# Altium schematic symbol library jlcpcb_2025_04_capacitors_extended_0603.schlib: 3668 symbols (part 19 of 20) (continued)
## RF18N180F500CT
designator C?  Capacitance: 18pF  (hidden comment: *)
Capacitor, Ceramic (MLCC), 18pF, 50V, NP0, SMD 0603; Manufacturer: Walsin Tech Corp; Manufacturer Part Number: RF18N180F500CT; Package Size: 0603; JLCPCB Basic Part: No; JLCPCB Part Number: C2909435; Supplier 1: LCSC; Category: Capacitors - MLCC; Supplier Part Number 1: C2909435; Voltage Rating: 50V; Temperature Coefficient: NP0; RoHS: Yes; ComponentLink1Description: Datasheet; ComponentLink1URL: https://wmsc.lcsc.com/wmsc/upload/file/pdf/v2/lcsc/2110281730_Walsin-Tech-Corp-RF18N180F500CT_C2909435.pdf; ComponentLink2Description: JLCPCB Part URL; ComponentLink2URL: https://jlcpcb.com/partdetail/C2909435; ComponentLink3Description: LCSC Part URL; ComponentLink3URL: https://lcsc.com/product-detail/Multilayer-Ceramic-Capacitors-MLCC---SMD-SMT_Walsin-Tech-Corp-Walsin-Tech-Corp-RF18N180F500CT_C2909435.html
footprint CAP-0603 (0603 (1608M) Capacitor)
pins: 1, 2

## RF18N470F500CT
designator C?  Capacitance: 47pF  (hidden comment: *)
Capacitor, Ceramic (MLCC), 47pF, 50V, NP0, SMD 0603; Manufacturer: Walsin Tech Corp; Manufacturer Part Number: RF18N470F500CT; Package Size: 0603; JLCPCB Basic Part: No; JLCPCB Part Number: C2909457; Supplier 1: LCSC; Category: Capacitors - MLCC; Supplier Part Number 1: C2909457; Voltage Rating: 50V; Temperature Coefficient: NP0; RoHS: Yes; ComponentLink1Description: Datasheet; ComponentLink1URL: https://wmsc.lcsc.com/wmsc/upload/file/pdf/v2/lcsc/2110281730_Walsin-Tech-Corp-RF18N470F500CT_C2909457.pdf; ComponentLink2Description: JLCPCB Part URL; ComponentLink2URL: https://jlcpcb.com/partdetail/C2909457; ComponentLink3Description: LCSC Part URL; ComponentLink3URL: https://lcsc.com/product-detail/Multilayer-Ceramic-Capacitors-MLCC---SMD-SMT_Walsin-Tech-Corp-Walsin-Tech-Corp-RF18N470F500CT_C2909457.html
footprint CAP-0603 (0603 (1608M) Capacitor)
pins: 1, 2

## SH18B104K101CT
designator C?  Capacitance: 100nF  (hidden comment: *)
Capacitor, Ceramic (MLCC), 100nF, 100V, X7R, SMD 0603; Manufacturer: Walsin Tech Corp; Manufacturer Part Number: SH18B104K101CT; Package Size: 0603; JLCPCB Basic Part: No; JLCPCB Part Number: C2894188; Supplier 1: LCSC; Category: Capacitors - MLCC; Supplier Part Number 1: C2894188; Voltage Rating: 100V; Temperature Coefficient: X7R; RoHS: Yes; ComponentLink1Description: Datasheet; ComponentLink1URL: https://wmsc.lcsc.com/wmsc/upload/file/pdf/v2/lcsc/2109081830_Walsin-Tech-Corp-SH18B104K101CT_C2894188.pdf; ComponentLink2Description: JLCPCB Part URL; ComponentLink2URL: https://jlcpcb.com/partdetail/C2894188; ComponentLink3Description: LCSC Part URL; ComponentLink3URL: https://lcsc.com/product-detail/Multilayer-Ceramic-Capacitors-MLCC---SMD-SMT_Walsin-Tech-Corp-Walsin-Tech-Corp-SH18B104K101CT_C2894188.html
footprint CAP-0603 (0603 (1608M) Capacitor)
pins: 1, 2

## TCC0603COG0R8B500CT
designator C?  Capacitance: 0.8pF  (hidden comment: *)
Capacitor, Ceramic (MLCC), 0.8pF, null, null, SMD 0603; Manufacturer: CCTC; Manufacturer Part Number: TCC0603COG0R8B500CT; Package Size: 0603; JLCPCB Basic Part: No; JLCPCB Part Number: C5375810; Supplier 1: LCSC; Category: Capacitors - MLCC; Supplier Part Number 1: C5375810; Voltage Rating: null; Temperature Coefficient: null; RoHS: Yes; ComponentLink1Description: Datasheet; ComponentLink1URL: https://wmsc.lcsc.com/wmsc/upload/file/pdf/v2/lcsc/2403281709_CCTC-TCC0603COG0R8B500CT_C5375810.pdf; ComponentLink2Description: JLCPCB Part URL; ComponentLink2URL: https://jlcpcb.com/partdetail/C5375810; ComponentLink3Description: LCSC Part URL; ComponentLink3URL: https://lcsc.com/product-detail/Multilayer-Ceramic-Capacitors-MLCC---SMD-SMT_CCTC-CCTC-TCC0603COG0R8B500CT_C5375810.html
footprint CAP-0603 (0603 (1608M) Capacitor)
pins: 1, 2

## TCC0603COG1R0C500CT
designator C?  Capacitance: 1pF  (hidden comment: *)
Capacitor, Ceramic (MLCC), 1pF, 50V, C0G, SMD 0603; Manufacturer: CCTC; Manufacturer Part Number: TCC0603COG1R0C500CT; Package Size: 0603; JLCPCB Basic Part: No; JLCPCB Part Number: C282497; Supplier 1: LCSC; Category: Capacitors - MLCC; Supplier Part Number 1: C282497; Voltage Rating: 50V; Temperature Coefficient: C0G; RoHS: Yes; ComponentLink1Description: Datasheet; ComponentLink1URL: https://wmsc.lcsc.com/wmsc/upload/file/pdf/v2/lcsc/2304140030_CCTC-TCC0603COG1R0C500CT_C282497.pdf; ComponentLink2Description: JLCPCB Part URL; ComponentLink2URL: https://jlcpcb.com/partdetail/C282497; ComponentLink3Description: LCSC Part URL; ComponentLink3URL: https://lcsc.com/product-detail/Multilayer-Ceramic-Capacitors-MLCC---SMD-SMT_CCTC-CCTC-TCC0603COG1R0C500CT_C282497.html
footprint CAP-0603 (0603 (1608M) Capacitor)
pins: 1, 2

## TCC0603COG1R2C500CT
designator C?  Capacitance: 1.2pF  (hidden comment: *)
Capacitor, Ceramic (MLCC), 1.2pF, 50V, C0G, SMD 0603; Manufacturer: CCTC; Manufacturer Part Number: TCC0603COG1R2C500CT; Package Size: 0603; JLCPCB Basic Part: No; JLCPCB Part Number: C282498; Supplier 1: LCSC; Category: Capacitors - MLCC; Supplier Part Number 1: C282498; Voltage Rating: 50V; Temperature Coefficient: C0G; RoHS: Yes; ComponentLink1Description: Datasheet; ComponentLink1URL: https://wmsc.lcsc.com/wmsc/upload/file/pdf/v2/lcsc/2304140030_CCTC-TCC0603COG1R2C500CT_C282498.pdf; ComponentLink2Description: JLCPCB Part URL; ComponentLink2URL: https://jlcpcb.com/partdetail/C282498; ComponentLink3Description: LCSC Part URL; ComponentLink3URL: https://lcsc.com/product-detail/Multilayer-Ceramic-Capacitors-MLCC---SMD-SMT_CCTC-CCTC-TCC0603COG1R2C500CT_C282498.html
footprint CAP-0603 (0603 (1608M) Capacitor)
pins: 1, 2

## TCC0603COG1R5C500CT
designator C?  Capacitance: 1.5pF  (hidden comment: *)
Capacitor, Ceramic (MLCC), 1.5pF, 50V, C0G, SMD 0603; Manufacturer: CCTC; Manufacturer Part Number: TCC0603COG1R5C500CT; Package Size: 0603; JLCPCB Basic Part: No; JLCPCB Part Number: C376772; Supplier 1: LCSC; Category: Capacitors - MLCC; Supplier Part Number 1: C376772; Voltage Rating: 50V; Temperature Coefficient: C0G; RoHS: Yes; ComponentLink1Description: Datasheet; ComponentLink1URL: https://wmsc.lcsc.com/wmsc/upload/file/pdf/v2/lcsc/2304140030_CCTC-TCC0603COG1R5C500CT_C376772.pdf; ComponentLink2Description: JLCPCB Part URL; ComponentLink2URL: https://jlcpcb.com/partdetail/C376772; ComponentLink3Description: LCSC Part URL; ComponentLink3URL: https://lcsc.com/product-detail/Multilayer-Ceramic-Capacitors-MLCC---SMD-SMT_CCTC-CCTC-TCC0603COG1R5C500CT_C376772.html
footprint CAP-0603 (0603 (1608M) Capacitor)
pins: 1, 2

## TCC0603COG2R0B500CT
designator C?  Capacitance: 2pF  (hidden comment: *)
Capacitor, Ceramic (MLCC), 2pF, null, C0G, SMD 0603; Manufacturer: CCTC; Manufacturer Part Number: TCC0603COG2R0B500CT; Package Size: 0603; JLCPCB Basic Part: No; JLCPCB Part Number: C5375823; Supplier 1: LCSC; Category: Capacitors - MLCC; Supplier Part Number 1: C5375823; Voltage Rating: null; Temperature Coefficient: C0G; RoHS: Yes; ComponentLink1Description: Datasheet; ComponentLink2Description: JLCPCB Part URL; ComponentLink2URL: https://jlcpcb.com/partdetail/C5375823; ComponentLink3Description: LCSC Part URL; ComponentLink3URL: https://lcsc.com/product-detail/Multilayer-Ceramic-Capacitors-MLCC---SMD-SMT_CCTC-CCTC-TCC0603COG2R0B500CT_C5375823.html
footprint CAP-0603 (0603 (1608M) Capacitor)
pins: 1, 2

## TCC0603COG2R0C500CT
designator C?  Capacitance: 2pF  (hidden comment: *)
Capacitor, Ceramic (MLCC), 2pF, 50V, C0G, SMD 0603; Manufacturer: CCTC; Manufacturer Part Number: TCC0603COG2R0C500CT; Package Size: 0603; JLCPCB Basic Part: No; JLCPCB Part Number: C282500; Supplier 1: LCSC; Category: Capacitors - MLCC; Supplier Part Number 1: C282500; Voltage Rating: 50V; Temperature Coefficient: C0G; RoHS: Yes; ComponentLink1Description: Datasheet; ComponentLink1URL: https://wmsc.lcsc.com/wmsc/upload/file/pdf/v2/lcsc/2304140030_CCTC-TCC0603COG2R0C500CT_C282500.pdf; ComponentLink2Description: JLCPCB Part URL; ComponentLink2URL: https://jlcpcb.com/partdetail/C282500; ComponentLink3Description: LCSC Part URL; ComponentLink3URL: https://lcsc.com/product-detail/Multilayer-Ceramic-Capacitors-MLCC---SMD-SMT_CCTC-CCTC-TCC0603COG2R0C500CT_C282500.html
footprint CAP-0603 (0603 (1608M) Capacitor)
pins: 1, 2

## TCC0603COG2R2C500CT
designator C?  Capacitance: 2.2pF  (hidden comment: *)
Capacitor, Ceramic (MLCC), 2.2pF, 50V, C0G, SMD 0603; Manufacturer: CCTC; Manufacturer Part Number: TCC0603COG2R2C500CT; Package Size: 0603; JLCPCB Basic Part: No; JLCPCB Part Number: C376780; Supplier 1: LCSC; Category: Capacitors - MLCC; Supplier Part Number 1: C376780; Voltage Rating: 50V; Temperature Coefficient: C0G; RoHS: Yes; ComponentLink1Description: Datasheet; ComponentLink1URL: https://wmsc.lcsc.com/wmsc/upload/file/pdf/v2/lcsc/2304140030_CCTC-TCC0603COG2R2C500CT_C376780.pdf; ComponentLink2Description: JLCPCB Part URL; ComponentLink2URL: https://jlcpcb.com/partdetail/C376780; ComponentLink3Description: LCSC Part URL; ComponentLink3URL: https://lcsc.com/product-detail/Multilayer-Ceramic-Capacitors-MLCC---SMD-SMT_CCTC-CCTC-TCC0603COG2R2C500CT_C376780.html
footprint CAP-0603 (0603 (1608M) Capacitor)
pins: 1, 2

## TCC0603COG2R4B500CT
designator C?  Capacitance: 2.4pF  (hidden comment: *)
Capacitor, Ceramic (MLCC), 2.4pF, null, null, SMD 0603; Manufacturer: CCTC; Manufacturer Part Number: TCC0603COG2R4B500CT; Package Size: 0603; JLCPCB Basic Part: No; JLCPCB Part Number: C5448887; Supplier 1: LCSC; Category: Capacitors - MLCC; Supplier Part Number 1: C5448887; Voltage Rating: null; Temperature Coefficient: null; RoHS: Yes; ComponentLink1Description: Datasheet; ComponentLink2Description: JLCPCB Part URL; ComponentLink2URL: https://jlcpcb.com/partdetail/C5448887; ComponentLink3Description: LCSC Part URL; ComponentLink3URL: https://lcsc.com/product-detail/Multilayer-Ceramic-Capacitors-MLCC---SMD-SMT_CCTC-CCTC-TCC0603COG2R4B500CT_C5448887.html
footprint CAP-0603 (0603 (1608M) Capacitor)
pins: 1, 2

## TCC0603COG2R4C500CT
designator C?  Capacitance: 2.4pF  (hidden comment: *)
Capacitor, Ceramic (MLCC), 2.4pF, 50V, C0G, SMD 0603; Manufacturer: CCTC; Manufacturer Part Number: TCC0603COG2R4C500CT; Package Size: 0603; JLCPCB Basic Part: No; JLCPCB Part Number: C880623; Supplier 1: LCSC; Category: Capacitors - MLCC; Supplier Part Number 1: C880623; Voltage Rating: 50V; Temperature Coefficient: C0G; RoHS: Yes; ComponentLink1Description: Datasheet; ComponentLink1URL: https://wmsc.lcsc.com/wmsc/upload/file/pdf/v2/lcsc/2304140030_CCTC-TCC0603COG2R4C500CT_C880623.pdf; ComponentLink2Description: JLCPCB Part URL; ComponentLink2URL: https://jlcpcb.com/partdetail/C880623; ComponentLink3Description: LCSC Part URL; ComponentLink3URL: https://lcsc.com/product-detail/Multilayer-Ceramic-Capacitors-MLCC---SMD-SMT_CCTC-CCTC-TCC0603COG2R4C500CT_C880623.html
footprint CAP-0603 (0603 (1608M) Capacitor)
pins: 1, 2

## TCC0603COG2R7C500CT
designator C?  Capacitance: 2.7pF  (hidden comment: *)
Capacitor, Ceramic (MLCC), 2.7pF, 50V, C0G, SMD 0603; Manufacturer: CCTC; Manufacturer Part Number: TCC0603COG2R7C500CT; Package Size: 0603; JLCPCB Basic Part: No; JLCPCB Part Number: C376781; Supplier 1: LCSC; Category: Capacitors - MLCC; Supplier Part Number 1: C376781; Voltage Rating: 50V; Temperature Coefficient: C0G; RoHS: Yes; ComponentLink1Description: Datasheet; ComponentLink1URL: https://wmsc.lcsc.com/wmsc/upload/file/pdf/v2/lcsc/2304140030_CCTC-TCC0603COG2R7C500CT_C376781.pdf; ComponentLink2Description: JLCPCB Part URL; ComponentLink2URL: https://jlcpcb.com/partdetail/C376781; ComponentLink3Description: LCSC Part URL; ComponentLink3URL: https://lcsc.com/product-detail/Multilayer-Ceramic-Capacitors-MLCC---SMD-SMT_CCTC-CCTC-TCC0603COG2R7C500CT_C376781.html
footprint CAP-0603 (0603 (1608M) Capacitor)
pins: 1, 2

## TCC0603COG3R0C500CT
designator C?  Capacitance: 3pF  (hidden comment: *)
Capacitor, Ceramic (MLCC), 3pF, 50V, C0G, SMD 0603; Manufacturer: CCTC; Manufacturer Part Number: TCC0603COG3R0C500CT; Package Size: 0603; JLCPCB Basic Part: No; JLCPCB Part Number: C376785; Supplier 1: LCSC; Category: Capacitors - MLCC; Supplier Part Number 1: C376785; Voltage Rating: 50V; Temperature Coefficient: C0G; RoHS: Yes; ComponentLink1Description: Datasheet; ComponentLink1URL: https://wmsc.lcsc.com/wmsc/upload/file/pdf/v2/lcsc/2304140030_CCTC-TCC0603COG3R0C500CT_C376785.pdf; ComponentLink2Description: JLCPCB Part URL; ComponentLink2URL: https://jlcpcb.com/partdetail/C376785; ComponentLink3Description: LCSC Part URL; ComponentLink3URL: https://lcsc.com/product-detail/Multilayer-Ceramic-Capacitors-MLCC---SMD-SMT_CCTC-CCTC-TCC0603COG3R0C500CT_C376785.html
footprint CAP-0603 (0603 (1608M) Capacitor)
pins: 1, 2

## TCC0603COG3R3C500CT
designator C?  Capacitance: 3.3pF  (hidden comment: *)
Capacitor, Ceramic (MLCC), 3.3pF, 50V, C0G, SMD 0603; Manufacturer: CCTC; Manufacturer Part Number: TCC0603COG3R3C500CT; Package Size: 0603; JLCPCB Basic Part: No; JLCPCB Part Number: C282503; Supplier 1: LCSC; Category: Capacitors - MLCC; Supplier Part Number 1: C282503; Voltage Rating: 50V; Temperature Coefficient: C0G; RoHS: Yes; ComponentLink1Description: Datasheet; ComponentLink1URL: https://wmsc.lcsc.com/wmsc/upload/file/pdf/v2/lcsc/2304140030_CCTC-TCC0603COG3R3C500CT_C282503.pdf; ComponentLink2Description: JLCPCB Part URL; ComponentLink2URL: https://jlcpcb.com/partdetail/C282503; ComponentLink3Description: LCSC Part URL; ComponentLink3URL: https://lcsc.com/product-detail/Multilayer-Ceramic-Capacitors-MLCC---SMD-SMT_CCTC-CCTC-TCC0603COG3R3C500CT_C282503.html
footprint CAP-0603 (0603 (1608M) Capacitor)
pins: 1, 2

## TCC0603COG3R6C500CT
designator C?  Capacitance: 3.6pF  (hidden comment: *)
Capacitor, Ceramic (MLCC), 3.6pF, 50V, C0G, SMD 0603; Manufacturer: CCTC; Manufacturer Part Number: TCC0603COG3R6C500CT; Package Size: 0603; JLCPCB Basic Part: No; JLCPCB Part Number: C282504; Supplier 1: LCSC; Category: Capacitors - MLCC; Supplier Part Number 1: C282504; Voltage Rating: 50V; Temperature Coefficient: C0G; RoHS: Yes; ComponentLink1Description: Datasheet; ComponentLink1URL: https://wmsc.lcsc.com/wmsc/upload/file/pdf/v2/lcsc/2304140030_CCTC-TCC0603COG3R6C500CT_C282504.pdf; ComponentLink2Description: JLCPCB Part URL; ComponentLink2URL: https://jlcpcb.com/partdetail/C282504; ComponentLink3Description: LCSC Part URL; ComponentLink3URL: https://lcsc.com/product-detail/Multilayer-Ceramic-Capacitors-MLCC---SMD-SMT_CCTC-CCTC-TCC0603COG3R6C500CT_C282504.html
footprint CAP-0603 (0603 (1608M) Capacitor)
pins: 1, 2

## TCC0603COG4R0C500CT
designator C?  Capacitance: 4pF  (hidden comment: *)
Capacitor, Ceramic (MLCC), 4pF, 50V, C0G, SMD 0603; Manufacturer: CCTC; Manufacturer Part Number: TCC0603COG4R0C500CT; Package Size: 0603; JLCPCB Basic Part: No; JLCPCB Part Number: C376789; Supplier 1: LCSC; Category: Capacitors - MLCC; Supplier Part Number 1: C376789; Voltage Rating: 50V; Temperature Coefficient: C0G; RoHS: Yes; ComponentLink1Description: Datasheet; ComponentLink1URL: https://wmsc.lcsc.com/wmsc/upload/file/pdf/v2/lcsc/2304140030_CCTC-TCC0603COG4R0C500CT_C376789.pdf; ComponentLink2Description: JLCPCB Part URL; ComponentLink2URL: https://jlcpcb.com/partdetail/C376789; ComponentLink3Description: LCSC Part URL; ComponentLink3URL: https://lcsc.com/product-detail/Multilayer-Ceramic-Capacitors-MLCC---SMD-SMT_CCTC-CCTC-TCC0603COG4R0C500CT_C376789.html
footprint CAP-0603 (0603 (1608M) Capacitor)
pins: 1, 2

## TCC0603COG4R3C500CT
designator C?  Capacitance: 4.3pF  (hidden comment: *)
Capacitor, Ceramic (MLCC), 4.3pF, 50V, C0G, SMD 0603; Manufacturer: CCTC; Manufacturer Part Number: TCC0603COG4R3C500CT; Package Size: 0603; JLCPCB Basic Part: No; JLCPCB Part Number: C376790; Supplier 1: LCSC; Category: Capacitors - MLCC; Supplier Part Number 1: C376790; Voltage Rating: 50V; Temperature Coefficient: C0G; RoHS: Yes; ComponentLink1Description: Datasheet; ComponentLink1URL: https://wmsc.lcsc.com/wmsc/upload/file/pdf/v2/lcsc/2304140030_CCTC-TCC0603COG4R3C500CT_C376790.pdf; ComponentLink2Description: JLCPCB Part URL; ComponentLink2URL: https://jlcpcb.com/partdetail/C376790; ComponentLink3Description: LCSC Part URL; ComponentLink3URL: https://lcsc.com/product-detail/Multilayer-Ceramic-Capacitors-MLCC---SMD-SMT_CCTC-CCTC-TCC0603COG4R3C500CT_C376790.html
footprint CAP-0603 (0603 (1608M) Capacitor)
pins: 1, 2

## TCC0603COG4R7C500CT
designator C?  Capacitance: 4.7pF  (hidden comment: *)
Capacitor, Ceramic (MLCC), 4.7pF, 50V, C0G, SMD 0603; Manufacturer: CCTC; Manufacturer Part Number: TCC0603COG4R7C500CT; Package Size: 0603; JLCPCB Basic Part: No; JLCPCB Part Number: C282506; Supplier 1: LCSC; Category: Capacitors - MLCC; Supplier Part Number 1: C282506; Voltage Rating: 50V; Temperature Coefficient: C0G; RoHS: Yes; ComponentLink1Description: Datasheet; ComponentLink1URL: https://wmsc.lcsc.com/wmsc/upload/file/pdf/v2/lcsc/2304140030_CCTC-TCC0603COG4R7C500CT_C282506.pdf; ComponentLink2Description: JLCPCB Part URL; ComponentLink2URL: https://jlcpcb.com/partdetail/C282506; ComponentLink3Description: LCSC Part URL; ComponentLink3URL: https://lcsc.com/product-detail/Multilayer-Ceramic-Capacitors-MLCC---SMD-SMT_CCTC-CCTC-TCC0603COG4R7C500CT_C282506.html
footprint CAP-0603 (0603 (1608M) Capacitor)
pins: 1, 2

## TCC0603COG4R7D500CT
designator C?  Capacitance: 4.7pF  (hidden comment: *)
Capacitor, Ceramic (MLCC), 4.7pF, 50V, C0G, SMD 0603; Manufacturer: CCTC; Manufacturer Part Number: TCC0603COG4R7D500CT; Package Size: 0603; JLCPCB Basic Part: No; JLCPCB Part Number: C376791; Supplier 1: LCSC; Category: Capacitors - MLCC; Supplier Part Number 1: C376791; Voltage Rating: 50V; Temperature Coefficient: C0G; RoHS: Yes; ComponentLink1Description: Datasheet; ComponentLink1URL: https://wmsc.lcsc.com/wmsc/upload/file/pdf/v2/lcsc/2304140030_CCTC-TCC0603COG4R7D500CT_C376791.pdf; ComponentLink2Description: JLCPCB Part URL; ComponentLink2URL: https://jlcpcb.com/partdetail/C376791; ComponentLink3Description: LCSC Part URL; ComponentLink3URL: https://lcsc.com/product-detail/Multilayer-Ceramic-Capacitors-MLCC---SMD-SMT_CCTC-CCTC-TCC0603COG4R7D500CT_C376791.html
footprint CAP-0603 (0603 (1608M) Capacitor)
pins: 1, 2

## TCC0603COG5R0C500CT
designator C?  Capacitance: 5pF  (hidden comment: *)
Capacitor, Ceramic (MLCC), 5pF, 50V, C0G, SMD 0603; Manufacturer: CCTC; Manufacturer Part Number: TCC0603COG5R0C500CT; Package Size: 0603; JLCPCB Basic Part: No; JLCPCB Part Number: C376794; Supplier 1: LCSC; Category: Capacitors - MLCC; Supplier Part Number 1: C376794; Voltage Rating: 50V; Temperature Coefficient: C0G; RoHS: Yes; ComponentLink1Description: Datasheet; ComponentLink1URL: https://wmsc.lcsc.com/wmsc/upload/file/pdf/v2/lcsc/2304140030_CCTC-TCC0603COG5R0C500CT_C376794.pdf; ComponentLink2Description: JLCPCB Part URL; ComponentLink2URL: https://jlcpcb.com/partdetail/C376794; ComponentLink3Description: LCSC Part URL; ComponentLink3URL: https://lcsc.com/product-detail/Multilayer-Ceramic-Capacitors-MLCC---SMD-SMT_CCTC-CCTC-TCC0603COG5R0C500CT_C376794.html
footprint CAP-0603 (0603 (1608M) Capacitor)
pins: 1, 2

## TCC0603COG5R0D500CT
designator C?  Capacitance: 5pF  (hidden comment: *)
Capacitor, Ceramic (MLCC), 5pF, 50V, C0G, SMD 0603; Manufacturer: CCTC; Manufacturer Part Number: TCC0603COG5R0D500CT; Package Size: 0603; JLCPCB Basic Part: No; JLCPCB Part Number: C376795; Supplier 1: LCSC; Category: Capacitors - MLCC; Supplier Part Number 1: C376795; Voltage Rating: 50V; Temperature Coefficient: C0G; RoHS: Yes; ComponentLink1Description: Datasheet; ComponentLink1URL: https://wmsc.lcsc.com/wmsc/upload/file/pdf/v2/lcsc/2304140030_CCTC-TCC0603COG5R0D500CT_C376795.pdf; ComponentLink2Description: JLCPCB Part URL; ComponentLink2URL: https://jlcpcb.com/partdetail/C376795; ComponentLink3Description: LCSC Part URL; ComponentLink3URL: https://lcsc.com/product-detail/Multilayer-Ceramic-Capacitors-MLCC---SMD-SMT_CCTC-CCTC-TCC0603COG5R0D500CT_C376795.html
footprint CAP-0603 (0603 (1608M) Capacitor)
pins: 1, 2

## TCC0603COG5R6C500CT
designator C?  Capacitance: 5.6pF  (hidden comment: *)
Capacitor, Ceramic (MLCC), 5.6pF, 50V, C0G, SMD 0603; Manufacturer: CCTC; Manufacturer Part Number: TCC0603COG5R6C500CT; Package Size: 0603; JLCPCB Basic Part: No; JLCPCB Part Number: C376796; Supplier 1: LCSC; Category: Capacitors - MLCC; Supplier Part Number 1: C376796; Voltage Rating: 50V; Temperature Coefficient: C0G; RoHS: Yes; ComponentLink1Description: Datasheet; ComponentLink1URL: https://wmsc.lcsc.com/wmsc/upload/file/pdf/v2/lcsc/2304140030_CCTC-TCC0603COG5R6C500CT_C376796.pdf; ComponentLink2Description: JLCPCB Part URL; ComponentLink2URL: https://jlcpcb.com/partdetail/C376796; ComponentLink3Description: LCSC Part URL; ComponentLink3URL: https://lcsc.com/product-detail/Multilayer-Ceramic-Capacitors-MLCC---SMD-SMT_CCTC-CCTC-TCC0603COG5R6C500CT_C376796.html
footprint CAP-0603 (0603 (1608M) Capacitor)
pins: 1, 2

## TCC0603COG5R6D500CT
designator C?  Capacitance: 5.6pF  (hidden comment: *)
Capacitor, Ceramic (MLCC), 5.6pF, 50V, C0G, SMD 0603; Manufacturer: CCTC; Manufacturer Part Number: TCC0603COG5R6D500CT; Package Size: 0603; JLCPCB Basic Part: No; JLCPCB Part Number: C376797; Supplier 1: LCSC; Category: Capacitors - MLCC; Supplier Part Number 1: C376797; Voltage Rating: 50V; Temperature Coefficient: C0G; RoHS: Yes; ComponentLink1Description: Datasheet; ComponentLink1URL: https://wmsc.lcsc.com/wmsc/upload/file/pdf/v2/lcsc/2304140030_CCTC-TCC0603COG5R6D500CT_C376797.pdf; ComponentLink2Description: JLCPCB Part URL; ComponentLink2URL: https://jlcpcb.com/partdetail/C376797; ComponentLink3Description: LCSC Part URL; ComponentLink3URL: https://lcsc.com/product-detail/Multilayer-Ceramic-Capacitors-MLCC---SMD-SMT_CCTC-CCTC-TCC0603COG5R6D500CT_C376797.html
footprint CAP-0603 (0603 (1608M) Capacitor)
pins: 1, 2

## TCC0603COG6R0C500CT
designator C?  Capacitance: 6pF  (hidden comment: *)
Capacitor, Ceramic (MLCC), 6pF, 50V, C0G, SMD 0603; Manufacturer: CCTC; Manufacturer Part Number: TCC0603COG6R0C500CT; Package Size: 0603; JLCPCB Basic Part: No; JLCPCB Part Number: C376799; Supplier 1: LCSC; Category: Capacitors - MLCC; Supplier Part Number 1: C376799; Voltage Rating: 50V; Temperature Coefficient: C0G; RoHS: Yes; ComponentLink1Description: Datasheet; ComponentLink1URL: https://wmsc.lcsc.com/wmsc/upload/file/pdf/v2/lcsc/2304140030_CCTC-TCC0603COG6R0C500CT_C376799.pdf; ComponentLink2Description: JLCPCB Part URL; ComponentLink2URL: https://jlcpcb.com/partdetail/C376799; ComponentLink3Description: LCSC Part URL; ComponentLink3URL: https://lcsc.com/product-detail/Multilayer-Ceramic-Capacitors-MLCC---SMD-SMT_CCTC-CCTC-TCC0603COG6R0C500CT_C376799.html
footprint CAP-0603 (0603 (1608M) Capacitor)
pins: 1, 2

## TCC0603COG6R0D500CT
designator C?  Capacitance: 6pF  (hidden comment: *)
Capacitor, Ceramic (MLCC), 6pF, 50V, C0G, SMD 0603; Manufacturer: CCTC; Manufacturer Part Number: TCC0603COG6R0D500CT; Package Size: 0603; JLCPCB Basic Part: No; JLCPCB Part Number: C282508; Supplier 1: LCSC; Category: Capacitors - MLCC; Supplier Part Number 1: C282508; Voltage Rating: 50V; Temperature Coefficient: C0G; RoHS: Yes; ComponentLink1Description: Datasheet; ComponentLink1URL: https://wmsc.lcsc.com/wmsc/upload/file/pdf/v2/lcsc/2304140030_CCTC-TCC0603COG6R0D500CT_C282508.pdf; ComponentLink2Description: JLCPCB Part URL; ComponentLink2URL: https://jlcpcb.com/partdetail/C282508; ComponentLink3Description: LCSC Part URL; ComponentLink3URL: https://lcsc.com/product-detail/Multilayer-Ceramic-Capacitors-MLCC---SMD-SMT_CCTC-CCTC-TCC0603COG6R0D500CT_C282508.html
footprint CAP-0603 (0603 (1608M) Capacitor)
pins: 1, 2

## TCC0603COG6R8D500CT
designator C?  Capacitance: 6.8pF  (hidden comment: *)
Capacitor, Ceramic (MLCC), 6.8pF, 50V, C0G, SMD 0603; Manufacturer: CCTC; Manufacturer Part Number: TCC0603COG6R8D500CT; Package Size: 0603; JLCPCB Basic Part: No; JLCPCB Part Number: C376801; Supplier 1: LCSC; Category: Capacitors - MLCC; Supplier Part Number 1: C376801; Voltage Rating: 50V; Temperature Coefficient: C0G; RoHS: Yes; ComponentLink1Description: Datasheet; ComponentLink1URL: https://wmsc.lcsc.com/wmsc/upload/file/pdf/v2/lcsc/2304140030_CCTC-TCC0603COG6R8D500CT_C376801.pdf; ComponentLink2Description: JLCPCB Part URL; ComponentLink2URL: https://jlcpcb.com/partdetail/C376801; ComponentLink3Description: LCSC Part URL; ComponentLink3URL: https://lcsc.com/product-detail/Multilayer-Ceramic-Capacitors-MLCC---SMD-SMT_CCTC-CCTC-TCC0603COG6R8D500CT_C376801.html
footprint CAP-0603 (0603 (1608M) Capacitor)
pins: 1, 2

## TCC0603COG7R0D500CT
designator C?  Capacitance: 7pF  (hidden comment: *)
Capacitor, Ceramic (MLCC), 7pF, 50V, C0G, SMD 0603; Manufacturer: CCTC; Manufacturer Part Number: TCC0603COG7R0D500CT; Package Size: 0603; JLCPCB Basic Part: No; JLCPCB Part Number: C282509; Supplier 1: LCSC; Category: Capacitors - MLCC; Supplier Part Number 1: C282509; Voltage Rating: 50V; Temperature Coefficient: C0G; RoHS: Yes; ComponentLink1Description: Datasheet; ComponentLink1URL: https://wmsc.lcsc.com/wmsc/upload/file/pdf/v2/lcsc/2304140030_CCTC-TCC0603COG7R0D500CT_C282509.pdf; ComponentLink2Description: JLCPCB Part URL; ComponentLink2URL: https://jlcpcb.com/partdetail/C282509; ComponentLink3Description: LCSC Part URL; ComponentLink3URL: https://lcsc.com/product-detail/Multilayer-Ceramic-Capacitors-MLCC---SMD-SMT_CCTC-CCTC-TCC0603COG7R0D500CT_C282509.html
footprint CAP-0603 (0603 (1608M) Capacitor)
pins: 1, 2

## TCC0603COG7R5D500CT
designator C?  Capacitance: 7.5pF  (hidden comment: *)
Capacitor, Ceramic (MLCC), 7.5pF, 50V, C0G, SMD 0603; Manufacturer: CCTC; Manufacturer Part Number: TCC0603COG7R5D500CT; Package Size: 0603; JLCPCB Basic Part: No; JLCPCB Part Number: C376802; Supplier 1: LCSC; Category: Capacitors - MLCC; Supplier Part Number 1: C376802; Voltage Rating: 50V; Temperature Coefficient: C0G; RoHS: Yes; ComponentLink1Description: Datasheet; ComponentLink1URL: https://wmsc.lcsc.com/wmsc/upload/file/pdf/v2/lcsc/2304140030_CCTC-TCC0603COG7R5D500CT_C376802.pdf; ComponentLink2Description: JLCPCB Part URL; ComponentLink2URL: https://jlcpcb.com/partdetail/C376802; ComponentLink3Description: LCSC Part URL; ComponentLink3URL: https://lcsc.com/product-detail/Multilayer-Ceramic-Capacitors-MLCC---SMD-SMT_CCTC-CCTC-TCC0603COG7R5D500CT_C376802.html
footprint CAP-0603 (0603 (1608M) Capacitor)
pins: 1, 2

## TCC0603COG8R0B500CT
designator C?  Capacitance: 8pF  (hidden comment: *)
Capacitor, Ceramic (MLCC), 8pF, 50V, null, SMD 0603; Manufacturer: CCTC; Manufacturer Part Number: TCC0603COG8R0B500CT; Package Size: 0603; JLCPCB Basic Part: No; JLCPCB Part Number: C7393890; Supplier 1: LCSC; Category: Capacitors - MLCC; Supplier Part Number 1: C7393890; Voltage Rating: 50V; Temperature Coefficient: null; RoHS: Yes; ComponentLink1Description: Datasheet; ComponentLink1URL: https://wmsc.lcsc.com/wmsc/upload/file/pdf/v2/lcsc/2306211554_CCTC-TCC0603COG8R0B500CT_C7393890.pdf; ComponentLink2Description: JLCPCB Part URL; ComponentLink2URL: https://jlcpcb.com/partdetail/C7393890; ComponentLink3Description: LCSC Part URL; ComponentLink3URL: https://lcsc.com/product-detail/Multilayer-Ceramic-Capacitors-MLCC---SMD-SMT_CCTC-CCTC-TCC0603COG8R0B500CT_C7393890.html
footprint CAP-0603 (0603 (1608M) Capacitor)
pins: 1, 2

## TCC0603COG8R0C500CT
designator C?  Capacitance: 8pF  (hidden comment: *)
Capacitor, Ceramic (MLCC), 8pF, 50V, C0G, SMD 0603; Manufacturer: CCTC; Manufacturer Part Number: TCC0603COG8R0C500CT; Package Size: 0603; JLCPCB Basic Part: No; JLCPCB Part Number: C376803; Supplier 1: LCSC; Category: Capacitors - MLCC; Supplier Part Number 1: C376803; Voltage Rating: 50V; Temperature Coefficient: C0G; RoHS: Yes; ComponentLink1Description: Datasheet; ComponentLink1URL: https://wmsc.lcsc.com/wmsc/upload/file/pdf/v2/lcsc/2304140030_CCTC-TCC0603COG8R0C500CT_C376803.pdf; ComponentLink2Description: JLCPCB Part URL; ComponentLink2URL: https://jlcpcb.com/partdetail/C376803; ComponentLink3Description: LCSC Part URL; ComponentLink3URL: https://lcsc.com/product-detail/Multilayer-Ceramic-Capacitors-MLCC---SMD-SMT_CCTC-CCTC-TCC0603COG8R0C500CT_C376803.html
footprint CAP-0603 (0603 (1608M) Capacitor)
pins: 1, 2

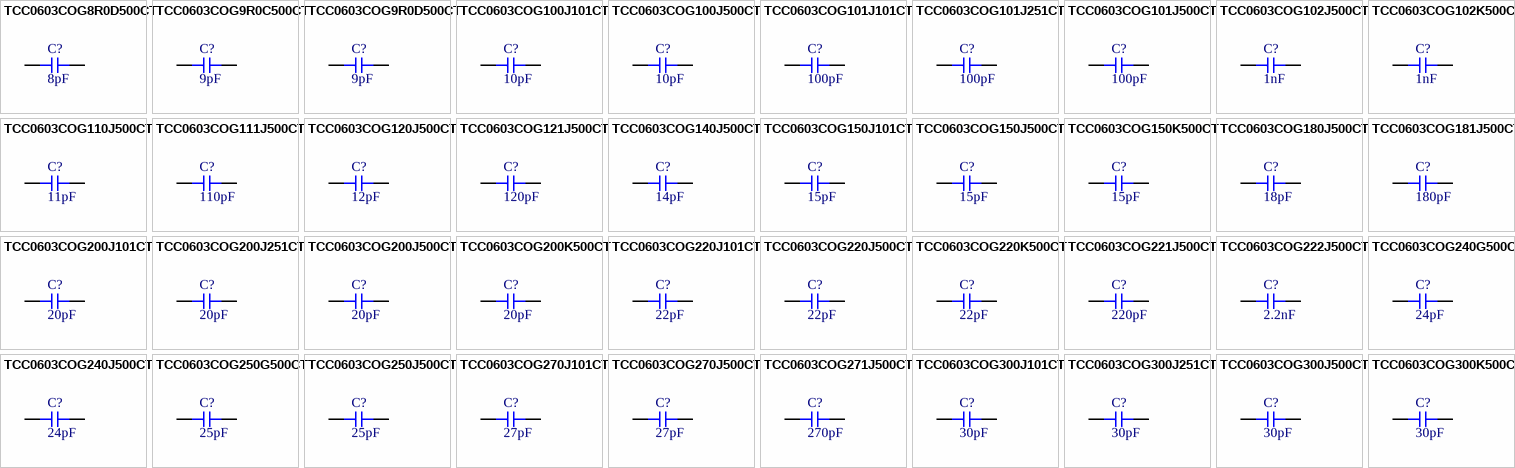
[diagram p85: symbols TCC0603COG8R0D500CT to TCC0603COG300K500CT]

## TCC0603COG8R0D500CT
designator C?  Capacitance: 8pF  (hidden comment: *)
Capacitor, Ceramic (MLCC), 8pF, 50V, C0G, SMD 0603; Manufacturer: CCTC; Manufacturer Part Number: TCC0603COG8R0D500CT; Package Size: 0603; JLCPCB Basic Part: No; JLCPCB Part Number: C282511; Supplier 1: LCSC; Category: Capacitors - MLCC; Supplier Part Number 1: C282511; Voltage Rating: 50V; Temperature Coefficient: C0G; RoHS: Yes; ComponentLink1Description: Datasheet; ComponentLink1URL: https://wmsc.lcsc.com/wmsc/upload/file/pdf/v2/lcsc/2304140030_CCTC-TCC0603COG8R0D500CT_C282511.pdf; ComponentLink2Description: JLCPCB Part URL; ComponentLink2URL: https://jlcpcb.com/partdetail/C282511; ComponentLink3Description: LCSC Part URL; ComponentLink3URL: https://lcsc.com/product-detail/Multilayer-Ceramic-Capacitors-MLCC---SMD-SMT_CCTC-CCTC-TCC0603COG8R0D500CT_C282511.html
footprint CAP-0603 (0603 (1608M) Capacitor)
pins: 1, 2

## TCC0603COG9R0C500CT
designator C?  Capacitance: 9pF  (hidden comment: *)
Capacitor, Ceramic (MLCC), 9pF, 50V, C0G, SMD 0603; Manufacturer: CCTC; Manufacturer Part Number: TCC0603COG9R0C500CT; Package Size: 0603; JLCPCB Basic Part: No; JLCPCB Part Number: C376805; Supplier 1: LCSC; Category: Capacitors - MLCC; Supplier Part Number 1: C376805; Voltage Rating: 50V; Temperature Coefficient: C0G; RoHS: Yes; ComponentLink1Description: Datasheet; ComponentLink1URL: https://wmsc.lcsc.com/wmsc/upload/file/pdf/v2/lcsc/2304140030_CCTC-TCC0603COG9R0C500CT_C376805.pdf; ComponentLink2Description: JLCPCB Part URL; ComponentLink2URL: https://jlcpcb.com/partdetail/C376805; ComponentLink3Description: LCSC Part URL; ComponentLink3URL: https://lcsc.com/product-detail/Multilayer-Ceramic-Capacitors-MLCC---SMD-SMT_CCTC-CCTC-TCC0603COG9R0C500CT_C376805.html
footprint CAP-0603 (0603 (1608M) Capacitor)
pins: 1, 2

## TCC0603COG9R0D500CT
designator C?  Capacitance: 9pF  (hidden comment: *)
Capacitor, Ceramic (MLCC), 9pF, 50V, C0G, SMD 0603; Manufacturer: CCTC; Manufacturer Part Number: TCC0603COG9R0D500CT; Package Size: 0603; JLCPCB Basic Part: No; JLCPCB Part Number: C282512; Supplier 1: LCSC; Category: Capacitors - MLCC; Supplier Part Number 1: C282512; Voltage Rating: 50V; Temperature Coefficient: C0G; RoHS: Yes; ComponentLink1Description: Datasheet; ComponentLink1URL: https://wmsc.lcsc.com/wmsc/upload/file/pdf/v2/lcsc/2304140030_CCTC-TCC0603COG9R0D500CT_C282512.pdf; ComponentLink2Description: JLCPCB Part URL; ComponentLink2URL: https://jlcpcb.com/partdetail/C282512; ComponentLink3Description: LCSC Part URL; ComponentLink3URL: https://lcsc.com/product-detail/Multilayer-Ceramic-Capacitors-MLCC---SMD-SMT_CCTC-CCTC-TCC0603COG9R0D500CT_C282512.html
footprint CAP-0603 (0603 (1608M) Capacitor)
pins: 1, 2

## TCC0603COG100J101CT
designator C?  Capacitance: 10pF  (hidden comment: *)
Capacitor, Ceramic (MLCC), 10pF, ±5%, 100V, C0G, ±5%, SMD 0603; Manufacturer: CCTC; Manufacturer Part Number: TCC0603COG100J101CT; Package Size: 0603; JLCPCB Basic Part: No; JLCPCB Part Number: C696892; Supplier 1: LCSC; Category: Capacitors - MLCC; Supplier Part Number 1: C696892; Tolerance: ±5%; Voltage Rating: 100V; Temperature Coefficient: C0G; RoHS: Yes; ComponentLink1Description: Datasheet; ComponentLink1URL: https://wmsc.lcsc.com/wmsc/upload/file/pdf/v2/lcsc/2304140030_CCTC-TCC0603COG100J101CT_C696892.pdf; ComponentLink2Description: JLCPCB Part URL; ComponentLink2URL: https://jlcpcb.com/partdetail/C696892; ComponentLink3Description: LCSC Part URL; ComponentLink3URL: https://lcsc.com/product-detail/Multilayer-Ceramic-Capacitors-MLCC---SMD-SMT_CCTC-CCTC-TCC0603COG100J101CT_C696892.html
footprint CAP-0603 (0603 (1608M) Capacitor)
pins: 1, 2

## TCC0603COG100J500CT
designator C?  Capacitance: 10pF  (hidden comment: *)
Capacitor, Ceramic (MLCC), 10pF, ±5%, 50V, C0G, ±5%, SMD 0603; Manufacturer: CCTC; Manufacturer Part Number: TCC0603COG100J500CT; Package Size: 0603; JLCPCB Basic Part: No; JLCPCB Part Number: C376764; Supplier 1: LCSC; Category: Capacitors - MLCC; Supplier Part Number 1: C376764; Tolerance: ±5%; Voltage Rating: 50V; Temperature Coefficient: C0G; RoHS: Yes; ComponentLink1Description: Datasheet; ComponentLink1URL: https://wmsc.lcsc.com/wmsc/upload/file/pdf/v2/lcsc/2304140030_CCTC-TCC0603COG100J500CT_C376764.pdf; ComponentLink2Description: JLCPCB Part URL; ComponentLink2URL: https://jlcpcb.com/partdetail/C376764; ComponentLink3Description: LCSC Part URL; ComponentLink3URL: https://lcsc.com/product-detail/Multilayer-Ceramic-Capacitors-MLCC---SMD-SMT_CCTC-CCTC-TCC0603COG100J500CT_C376764.html
footprint CAP-0603 (0603 (1608M) Capacitor)
pins: 1, 2

## TCC0603COG101J101CT
designator C?  Capacitance: 100pF  (hidden comment: *)
Capacitor, Ceramic (MLCC), 100pF, ±5%, 100V, C0G, ±5%, SMD 0603; Manufacturer: CCTC; Manufacturer Part Number: TCC0603COG101J101CT; Package Size: 0603; JLCPCB Basic Part: No; JLCPCB Part Number: C282495; Supplier 1: LCSC; Category: Capacitors - MLCC; Supplier Part Number 1: C282495; Tolerance: ±5%; Voltage Rating: 100V; Temperature Coefficient: C0G; RoHS: Yes; ComponentLink1Description: Datasheet; ComponentLink1URL: https://wmsc.lcsc.com/wmsc/upload/file/pdf/v2/lcsc/2304140030_CCTC-TCC0603COG101J101CT_C282495.pdf; ComponentLink2Description: JLCPCB Part URL; ComponentLink2URL: https://jlcpcb.com/partdetail/C282495; ComponentLink3Description: LCSC Part URL; ComponentLink3URL: https://lcsc.com/product-detail/Multilayer-Ceramic-Capacitors-MLCC---SMD-SMT_CCTC-CCTC-TCC0603COG101J101CT_C282495.html
footprint CAP-0603 (0603 (1608M) Capacitor)
pins: 1, 2

## TCC0603COG101J251CT
designator C?  Capacitance: 100pF  (hidden comment: *)
Capacitor, Ceramic (MLCC), 100pF, ±5%, 250V, C0G, ±5%, SMD 0603; Manufacturer: CCTC; Manufacturer Part Number: TCC0603COG101J251CT; Package Size: 0603; JLCPCB Basic Part: No; JLCPCB Part Number: C282496; Supplier 1: LCSC; Category: Capacitors - MLCC; Supplier Part Number 1: C282496; Tolerance: ±5%; Voltage Rating: 250V; Temperature Coefficient: C0G; RoHS: Yes; ComponentLink1Description: Datasheet; ComponentLink1URL: https://wmsc.lcsc.com/wmsc/upload/file/pdf/v2/lcsc/2304140030_CCTC-TCC0603COG101J251CT_C282496.pdf; ComponentLink2Description: JLCPCB Part URL; ComponentLink2URL: https://jlcpcb.com/partdetail/C282496; ComponentLink3Description: LCSC Part URL; ComponentLink3URL: https://lcsc.com/product-detail/Multilayer-Ceramic-Capacitors-MLCC---SMD-SMT_CCTC-CCTC-TCC0603COG101J251CT_C282496.html
footprint CAP-0603 (0603 (1608M) Capacitor)
pins: 1, 2

## TCC0603COG101J500CT
designator C?  Capacitance: 100pF  (hidden comment: *)
Capacitor, Ceramic (MLCC), 100pF, ±5%, 50V, C0G, ±5%, SMD 0603; Manufacturer: CCTC; Manufacturer Part Number: TCC0603COG101J500CT; Package Size: 0603; JLCPCB Basic Part: No; JLCPCB Part Number: C344186; Supplier 1: LCSC; Category: Capacitors - MLCC; Supplier Part Number 1: C344186; Tolerance: ±5%; Voltage Rating: 50V; Temperature Coefficient: C0G; RoHS: Yes; ComponentLink1Description: Datasheet; ComponentLink1URL: https://wmsc.lcsc.com/wmsc/upload/file/pdf/v2/lcsc/2304140030_CCTC-TCC0603COG101J500CT_C344186.pdf; ComponentLink2Description: JLCPCB Part URL; ComponentLink2URL: https://jlcpcb.com/partdetail/C344186; ComponentLink3Description: LCSC Part URL; ComponentLink3URL: https://lcsc.com/product-detail/Multilayer-Ceramic-Capacitors-MLCC---SMD-SMT_CCTC-CCTC-TCC0603COG101J500CT_C344186.html
footprint CAP-0603 (0603 (1608M) Capacitor)
pins: 1, 2

## TCC0603COG102J500CT
designator C?  Capacitance: 1nF  (hidden comment: *)
Capacitor, Ceramic (MLCC), 1nF, ±5%, 50V, C0G, ±5%, SMD 0603; Manufacturer: CCTC; Manufacturer Part Number: TCC0603COG102J500CT; Package Size: 0603; JLCPCB Basic Part: No; JLCPCB Part Number: C376765; Supplier 1: LCSC; Category: Capacitors - MLCC; Supplier Part Number 1: C376765; Tolerance: ±5%; Voltage Rating: 50V; Temperature Coefficient: C0G; RoHS: Yes; ComponentLink1Description: Datasheet; ComponentLink1URL: https://wmsc.lcsc.com/wmsc/upload/file/pdf/v2/lcsc/2304140030_CCTC-TCC0603COG102J500CT_C376765.pdf; ComponentLink2Description: JLCPCB Part URL; ComponentLink2URL: https://jlcpcb.com/partdetail/C376765; ComponentLink3Description: LCSC Part URL; ComponentLink3URL: https://lcsc.com/product-detail/Multilayer-Ceramic-Capacitors-MLCC---SMD-SMT_CCTC-CCTC-TCC0603COG102J500CT_C376765.html
footprint CAP-0603 (0603 (1608M) Capacitor)
pins: 1, 2

## TCC0603COG102K500CT
designator C?  Capacitance: 1nF  (hidden comment: *)
Capacitor, Ceramic (MLCC), 1nF, ±10%, 50V, null, ±10%, SMD 0603; Manufacturer: CCTC; Manufacturer Part Number: TCC0603COG102K500CT; Package Size: 0603; JLCPCB Basic Part: No; JLCPCB Part Number: C7393879; Supplier 1: LCSC; Category: Capacitors - MLCC; Supplier Part Number 1: C7393879; Tolerance: ±10%; Voltage Rating: 50V; Temperature Coefficient: null; RoHS: Yes; ComponentLink1Description: Datasheet; ComponentLink1URL: https://wmsc.lcsc.com/wmsc/upload/file/pdf/v2/lcsc/2306211554_CCTC-TCC0603COG102K500CT_C7393879.pdf; ComponentLink2Description: JLCPCB Part URL; ComponentLink2URL: https://jlcpcb.com/partdetail/C7393879; ComponentLink3Description: LCSC Part URL; ComponentLink3URL: https://lcsc.com/product-detail/Multilayer-Ceramic-Capacitors-MLCC---SMD-SMT_CCTC-CCTC-TCC0603COG102K500CT_C7393879.html
footprint CAP-0603 (0603 (1608M) Capacitor)
pins: 1, 2

## TCC0603COG110J500CT
designator C?  Capacitance: 11pF  (hidden comment: *)
Capacitor, Ceramic (MLCC), 11pF, ±5%, 50V, C0G, ±5%, SMD 0603; Manufacturer: CCTC; Manufacturer Part Number: TCC0603COG110J500CT; Package Size: 0603; JLCPCB Basic Part: No; JLCPCB Part Number: C376766; Supplier 1: LCSC; Category: Capacitors - MLCC; Supplier Part Number 1: C376766; Tolerance: ±5%; Voltage Rating: 50V; Temperature Coefficient: C0G; RoHS: Yes; ComponentLink1Description: Datasheet; ComponentLink1URL: https://wmsc.lcsc.com/wmsc/upload/file/pdf/v2/lcsc/2304140030_CCTC-TCC0603COG110J500CT_C376766.pdf; ComponentLink2Description: JLCPCB Part URL; ComponentLink2URL: https://jlcpcb.com/partdetail/C376766; ComponentLink3Description: LCSC Part URL; ComponentLink3URL: https://lcsc.com/product-detail/Multilayer-Ceramic-Capacitors-MLCC---SMD-SMT_CCTC-CCTC-TCC0603COG110J500CT_C376766.html
footprint CAP-0603 (0603 (1608M) Capacitor)
pins: 1, 2

## TCC0603COG111J500CT
designator C?  Capacitance: 110pF  (hidden comment: *)
Capacitor, Ceramic (MLCC), 110pF, ±5%, null, null, ±5%, SMD 0603; Manufacturer: CCTC; Manufacturer Part Number: TCC0603COG111J500CT; Package Size: 0603; JLCPCB Basic Part: No; JLCPCB Part Number: C5375804; Supplier 1: LCSC; Category: Capacitors - MLCC; Supplier Part Number 1: C5375804; Tolerance: ±5%; Voltage Rating: null; Temperature Coefficient: null; RoHS: Yes; ComponentLink1Description: Datasheet; ComponentLink1URL: https://wmsc.lcsc.com/wmsc/upload/file/pdf/v2/lcsc/2403281709_CCTC-TCC0603COG111J500CT_C5375804.pdf; ComponentLink2Description: JLCPCB Part URL; ComponentLink2URL: https://jlcpcb.com/partdetail/C5375804; ComponentLink3Description: LCSC Part URL; ComponentLink3URL: https://lcsc.com/product-detail/Multilayer-Ceramic-Capacitors-MLCC---SMD-SMT_CCTC-CCTC-TCC0603COG111J500CT_C5375804.html
footprint CAP-0603 (0603 (1608M) Capacitor)
pins: 1, 2

## TCC0603COG120J500CT
designator C?  Capacitance: 12pF  (hidden comment: *)
Capacitor, Ceramic (MLCC), 12pF, ±5%, 50V, C0G, ±5%, SMD 0603; Manufacturer: CCTC; Manufacturer Part Number: TCC0603COG120J500CT; Package Size: 0603; JLCPCB Basic Part: No; JLCPCB Part Number: C376767; Supplier 1: LCSC; Category: Capacitors - MLCC; Supplier Part Number 1: C376767; Tolerance: ±5%; Voltage Rating: 50V; Temperature Coefficient: C0G; RoHS: Yes; ComponentLink1Description: Datasheet; ComponentLink1URL: https://wmsc.lcsc.com/wmsc/upload/file/pdf/v2/lcsc/2304140030_CCTC-TCC0603COG120J500CT_C376767.pdf; ComponentLink2Description: JLCPCB Part URL; ComponentLink2URL: https://jlcpcb.com/partdetail/C376767; ComponentLink3Description: LCSC Part URL; ComponentLink3URL: https://lcsc.com/product-detail/Multilayer-Ceramic-Capacitors-MLCC---SMD-SMT_CCTC-CCTC-TCC0603COG120J500CT_C376767.html
footprint CAP-0603 (0603 (1608M) Capacitor)
pins: 1, 2

## TCC0603COG121J500CT
designator C?  Capacitance: 120pF  (hidden comment: *)
Capacitor, Ceramic (MLCC), 120pF, ±5%, 50V, C0G, ±5%, SMD 0603; Manufacturer: CCTC; Manufacturer Part Number: TCC0603COG121J500CT; Package Size: 0603; JLCPCB Basic Part: No; JLCPCB Part Number: C376768; Supplier 1: LCSC; Category: Capacitors - MLCC; Supplier Part Number 1: C376768; Tolerance: ±5%; Voltage Rating: 50V; Temperature Coefficient: C0G; RoHS: Yes; ComponentLink1Description: Datasheet; ComponentLink1URL: https://wmsc.lcsc.com/wmsc/upload/file/pdf/v2/lcsc/2304140030_CCTC-TCC0603COG121J500CT_C376768.pdf; ComponentLink2Description: JLCPCB Part URL; ComponentLink2URL: https://jlcpcb.com/partdetail/C376768; ComponentLink3Description: LCSC Part URL; ComponentLink3URL: https://lcsc.com/product-detail/Multilayer-Ceramic-Capacitors-MLCC---SMD-SMT_CCTC-CCTC-TCC0603COG121J500CT_C376768.html
footprint CAP-0603 (0603 (1608M) Capacitor)
pins: 1, 2

## TCC0603COG140J500CT
designator C?  Capacitance: 14pF  (hidden comment: *)
Capacitor, Ceramic (MLCC), 14pF, ±5%, null, null, ±5%, SMD 0603; Manufacturer: CCTC; Manufacturer Part Number: TCC0603COG140J500CT; Package Size: 0603; JLCPCB Basic Part: No; JLCPCB Part Number: C5360816; Supplier 1: LCSC; Category: Capacitors - MLCC; Supplier Part Number 1: C5360816; Tolerance: ±5%; Voltage Rating: null; Temperature Coefficient: null; RoHS: Yes; ComponentLink1Description: Datasheet; ComponentLink1URL: https://wmsc.lcsc.com/wmsc/upload/file/pdf/v2/lcsc/2403281708_CCTC-TCC0603COG140J500CT_C5360816.pdf; ComponentLink2Description: JLCPCB Part URL; ComponentLink2URL: https://jlcpcb.com/partdetail/C5360816; ComponentLink3Description: LCSC Part URL; ComponentLink3URL: https://lcsc.com/product-detail/Multilayer-Ceramic-Capacitors-MLCC---SMD-SMT_CCTC-CCTC-TCC0603COG140J500CT_C5360816.html
footprint CAP-0603 (0603 (1608M) Capacitor)
pins: 1, 2

## TCC0603COG150J101CT
designator C?  Capacitance: 15pF  (hidden comment: *)
Capacitor, Ceramic (MLCC), 15pF, ±5%, 100V, C0G, ±5%, SMD 0603; Manufacturer: CCTC; Manufacturer Part Number: TCC0603COG150J101CT; Package Size: 0603; JLCPCB Basic Part: No; JLCPCB Part Number: C696891; Supplier 1: LCSC; Category: Capacitors - MLCC; Supplier Part Number 1: C696891; Tolerance: ±5%; Voltage Rating: 100V; Temperature Coefficient: C0G; RoHS: Yes; ComponentLink1Description: Datasheet; ComponentLink1URL: https://wmsc.lcsc.com/wmsc/upload/file/pdf/v2/lcsc/2304140030_CCTC-TCC0603COG150J101CT_C696891.pdf; ComponentLink2Description: JLCPCB Part URL; ComponentLink2URL: https://jlcpcb.com/partdetail/C696891; ComponentLink3Description: LCSC Part URL; ComponentLink3URL: https://lcsc.com/product-detail/Multilayer-Ceramic-Capacitors-MLCC---SMD-SMT_CCTC-CCTC-TCC0603COG150J101CT_C696891.html
footprint CAP-0603 (0603 (1608M) Capacitor)
pins: 1, 2

## TCC0603COG150J500CT
designator C?  Capacitance: 15pF  (hidden comment: *)
Capacitor, Ceramic (MLCC), 15pF, ±5%, 50V, C0G, ±5%, SMD 0603; Manufacturer: CCTC; Manufacturer Part Number: TCC0603COG150J500CT; Package Size: 0603; JLCPCB Basic Part: No; JLCPCB Part Number: C376769; Supplier 1: LCSC; Category: Capacitors - MLCC; Supplier Part Number 1: C376769; Tolerance: ±5%; Voltage Rating: 50V; Temperature Coefficient: C0G; RoHS: Yes; ComponentLink1Description: Datasheet; ComponentLink1URL: https://wmsc.lcsc.com/wmsc/upload/file/pdf/v2/lcsc/2304140030_CCTC-TCC0603COG150J500CT_C376769.pdf; ComponentLink2Description: JLCPCB Part URL; ComponentLink2URL: https://jlcpcb.com/partdetail/C376769; ComponentLink3Description: LCSC Part URL; ComponentLink3URL: https://lcsc.com/product-detail/Multilayer-Ceramic-Capacitors-MLCC---SMD-SMT_CCTC-CCTC-TCC0603COG150J500CT_C376769.html
footprint CAP-0603 (0603 (1608M) Capacitor)
pins: 1, 2
